# Altium footprint library lib_ic_FOOTPRINTS.PcbLib: 98 footprints (part 1 of 7)
Each footprint in its own frame and in the unit in brackets; x right, y up, seen from the top. Pads: shape width x height; smd on the part's side, far side on the other; paste and mask are expansions set on the pad; w line width, h text height; cw(c..) or ccw(c..) is an arc to the next point about the centre after c.
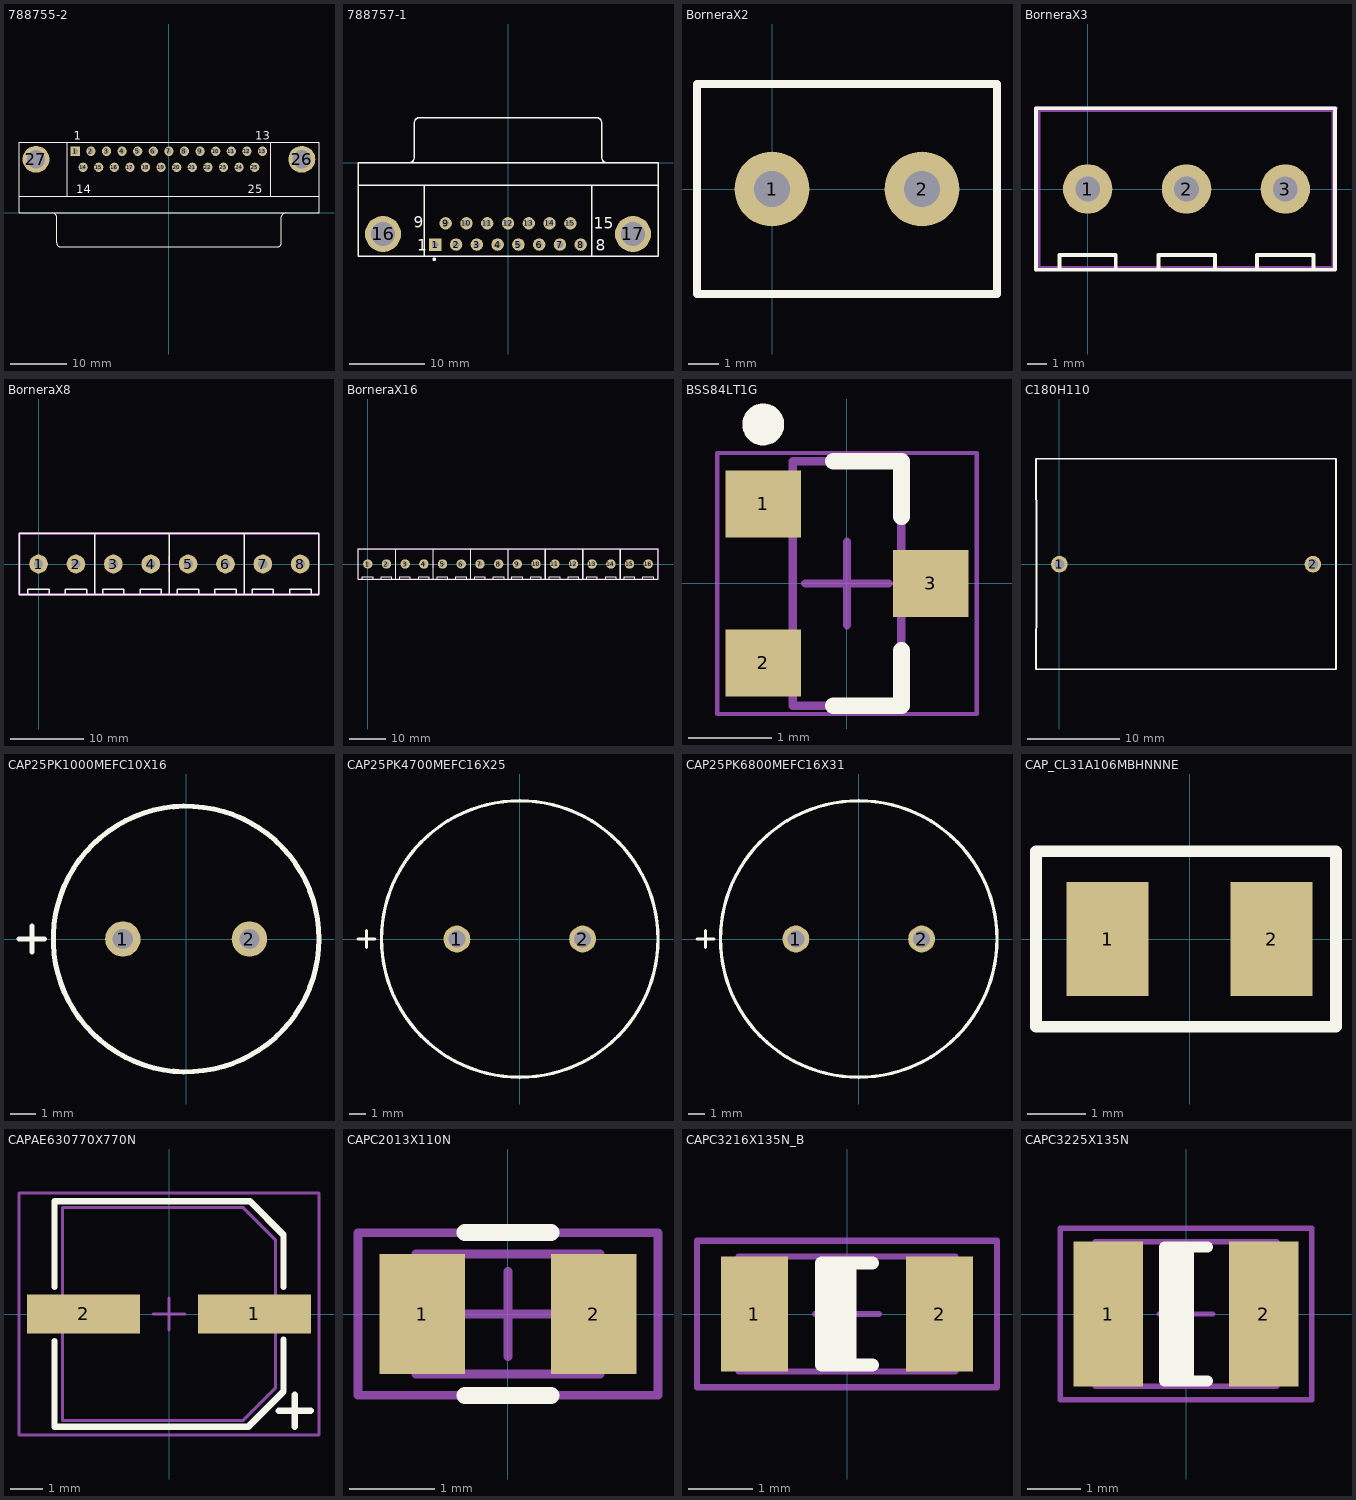
[diagram p0: the footprints below, top view; thin cyan lines are the x and y axes]

## 788755-2 [mil] "Connector; D Subminiature AMPLIMITE 2000; 25 Position; Right Angle"
height 501.97
pads (27):
  rect 65x65 hole 35: 1(-652.2,429.92)
  round 65 hole 35: 2(-543.5,429.92) 3(-434.8,429.92) 4(-326.1,429.92) 5(-217.4,429.92) 6(-108.7,429.92) 7(0,429.92) 8(108.7,429.92) 9(217.4,429.92) 10(326.1,429.92) 11(434.8,429.92) 12(543.5,429.92) 13(652.2,429.92) 14(-597.85,318.11) 15(-489.15,318.11) 16(-380.45,318.11) 17(-271.75,318.11) 18(-163.05,318.11) 19(-54.35,318.11) 20(54.35,318.11) 21(163.05,318.11) 22(271.75,318.11) 23(380.45,318.11) 24(489.15,318.11) 25(597.85,318.11)
  round 187.4 hole 128.35: 26(926.22,374.02) 27(-926.22,374.02)
Top Overlay:
  lines w7.87: -1044.57,118.11 1045.98,118.11 ; -810.12,-0.2 cw(c-810.12,-27.56) -782.76,-27.56 -782.76,-208.66 ; -782.56,-208.86 ccw(c-755.2,-208.86) -755.2,-236.22 756.61,-236.22 ccw(c756.61,-208.86) 783.98,-208.86 ; -707.95,118.11 -707.95,492.13 ; 709.37,118.11 709.37,492.13 ; 784.17,-208.66 784.17,-27.56 cw(c811.54,-27.56) 811.54,-0.2 ; -1044.57,0 -1044.57,492.13 1045.98,492.13 1045.98,0 -1044.57,0
  text "25" at 548.64,137.01 h59.06
  text "14" at -647.07,137.01 h59.06
  text "13" at 602.99,511.02 h59.06
  text "1" at -662.05,511.02 h59.06

## 788757-1 [mil] "Connector; D Subminiature AMPLIMITE 2000; 15 Position; Right Angle"
height 501.97
pads (17):
  rect 65x65 hole 35: 1(-381.69,-429.92)
  round 65 hole 35: 2(-272.64,-429.92) 3(-163.58,-429.92) 4(-54.53,-429.92) 5(54.53,-429.92) 6(163.58,-429.92) 7(272.64,-429.92) 8(381.69,-429.92) 9(-327.17,-318.11) 10(-218.11,-318.11) 11(-109.06,-318.11) 12(0,-318.11) 13(109.06,-318.11) 14(218.11,-318.11) 15(327.17,-318.11)
  round 188.98 hole 125.2: 16(-655.91,-374.02) 17(655.91,-374.02)
Top Overlay:
  circle w9.84: c-387.42,-507.5 r4.92
  lines w7.87: -787.4,-118.11 787.4,-118.11 ; -519.49,0.2 ccw(c-519.49,27.56) -492.13,27.56 -492.13,208.66 ; -491.93,208.86 cw(c-464.57,208.86) -464.57,236.22 464.57,236.22 cw(c464.57,208.86) 491.93,208.86 ; -438.58,-492.13 -438.58,-118.11 ; 438.58,-492.13 438.58,-118.11 ; 492.13,208.66 492.13,27.56 ccw(c519.49,27.56) 519.49,0.2 ; -787.4,-492.13 -787.4,0 787.4,0 787.4,-492.13 -787.4,-492.13
  text "1" at -477.5,-462.5 h59.06
  text "8" at 460,-462.5 h59.06
  text "15" at 450,-347.5 h59.06
  text "9" at -495,-342.5 h59.06

## BorneraX2 [mm]
pads (2):
  round 2.5 hole 1.2: 1(0,0) 2(5,0)
Top Overlay:
  lines w0.254: -2.5,-3.5 7.5,-3.5 7.5,3.5 -2.5,3.5 -2.5,-0.025 -2.5,-3.5
3D body: height 10, standoff 0, extent -2.375,-3.375 7.4,3.375

## BorneraX3 [mm]
pads (3):
  round 2.54 hole 1.27: 1(0,0) 2(5.08,0) 3(10.16,0)
Top Overlay:
  lines w0.2: -1.46,-4.15 -1.46,-3.4 1.44,-3.4 1.44,-4.15 ; 3.64,-4.15 3.64,-3.4 6.54,-3.4 6.54,-4.15 ; 8.7,-4.15 8.7,-3.4 11.6,-3.4 11.6,-4.15 ; 12.7,-4.15 -2.66,-4.15 -2.66,4.15 12.7,4.15 ; 12.707,-4.15 12.707,4.15
Mechanical 13:
  lines w0.2: 12.573,4.05 7.62,4.05 -2.54,4.05 -2.54,-4.05 7.62,-4.05 12.636,-4.05 12.636,4
Mechanical 15:
  lines w0.2: -2.66,-4.15 -2.66,4.15 7.69,4.15 ; 7.5,4.15 12.763,4.15
3D body "User Library-Terminal block 3 POS.STEP": height 10, standoff -3.05, extent -2.54,-3.173 12.7,4.327

## BorneraX8 [mm]
pads (8):
  round 2.54 hole 1.27: 1(0,0) 2(5.08,0) 3(10.16,0) 4(15.24,0) 5(20.32,0) 6(25.4,0) 7(30.48,0) 8(35.56,0)
Top Overlay:
  lines w0.2: -1.46,-4.15 -1.46,-3.4 1.44,-3.4 1.44,-4.15 ; 3.64,-4.15 3.64,-3.4 6.54,-3.4 6.54,-4.15 ; 7.5,-4.15 17.78,-4.15 ; 7.5,4.15 17.78,4.15 ; 7.62,4.127 7.598,4.15 -2.66,4.15 -2.66,-4.15 7.69,-4.15 ; 7.627,-4.15 7.627,4.15 ; 8.7,-4.15 8.7,-3.4 11.6,-3.4 11.6,-4.15 ; 13.8,-4.15 13.8,-3.4 16.7,-3.4 16.7,-4.15 ; 17.66,-4.15 27.94,-4.15 ; 17.66,4.15 27.94,4.15 ; 17.787,-4.15 17.787,4.15 ; 18.86,-4.15 18.86,-3.4 21.76,-3.4 21.76,-4.15 ; 23.96,-4.15 23.96,-3.4 26.86,-3.4 26.86,-4.15 ; 27.82,-4.15 38.107,-4.15 38.107,4.15 27.82,4.15 ; 27.947,-4.15 27.947,4.15 ; 29.02,-4.15 29.02,-3.4 31.92,-3.4 31.92,-4.15 ; 34.12,-4.15 34.12,-3.4 37.02,-3.4 37.02,-4.15
Mechanical 13:
  lines w0.2: -2.54,-4.05 -2.54,4.05 7.62,4.05 17.78,4.05 27.94,4.05 38.1,4.05 38.1,-4.05 27.94,-4.05 17.78,-4.05 7.62,-4.05 -2.54,-4.05
Mechanical 15:
  lines w0.1: 16.78,0 18.796,0 ; 17.78,-1.016 17.78,1
  lines w0.2: 7.5,-4.15 17.85,-4.15 ; 7.5,4.15 17.85,4.15 ; 7.69,-4.15 -2.66,-4.15 -2.66,4.15 7.69,4.15 ; 17.66,-4.15 28.01,-4.15 ; 17.66,4.15 28.01,4.15 ; 27.82,-4.15 38.1,-4.15 38.1,4.15 27.82,4.15
3D body "1729128.stp": height 10, standoff -3.5, extent -3.11,-4.05 7.62,4.05
3D body "1729128.stp": height 10, standoff -3.5, extent 7.05,-4.05 17.78,4.05
3D body "1729128.stp": height 10, standoff -3.5, extent 17.21,-4.05 27.94,4.05
3D body "1729128.stp": height 10, standoff -3.5, extent 27.37,-4.05 38.1,4.05

## BorneraX16 [mm]
pads (16):
  round 2.54 hole 1.27: 1(0,0) 2(5.08,0) 3(10.16,0) 4(15.24,0) 5(20.32,0) 6(25.4,0) 7(30.48,0) 8(35.56,0) 9(40.64,0) 10(45.72,0) 11(50.8,0) 12(55.88,0) 13(60.96,0) 14(66.04,0) 15(71.12,0) 16(76.2,0)
Top Overlay:
  lines w0.2: -1.46,-4.15 -1.46,-3.4 1.44,-3.4 1.44,-4.15 ; 3.64,-4.15 3.64,-3.4 6.54,-3.4 6.54,-4.15 ; 7.5,-4.15 17.78,-4.15 ; 7.5,4.15 17.78,4.15 ; 7.62,4.127 7.598,4.15 -2.66,4.15 -2.66,-4.15 7.69,-4.15 ; 7.627,-4.15 7.627,4.15 ; 8.7,-4.15 8.7,-3.4 11.6,-3.4 11.6,-4.15 ; 13.8,-4.15 13.8,-3.4 16.7,-3.4 16.7,-4.15 ; 17.66,-4.15 27.94,-4.15 ; 17.66,4.15 27.94,4.15 ; 17.787,-4.15 17.787,4.15 ; 18.86,-4.15 18.86,-3.4 21.76,-3.4 21.76,-4.15 ; 23.96,-4.15 23.96,-3.4 26.86,-3.4 26.86,-4.15 ; 27.82,-4.15 38.17,-4.15 ; 27.82,4.15 38.17,4.15 ; 27.947,-4.15 27.947,4.15 ; 29.02,-4.15 29.02,-3.4 31.92,-3.4 31.92,-4.15 ; 34.12,-4.15 34.12,-3.4 37.02,-3.4 37.02,-4.15 ; 37.98,-4.15 48.33,-4.15 ; 37.98,4.15 48.33,4.15 ; 38.107,-4.15 38.107,4.15 ; 38.22,-4.15 38.22,4.15 ; 39.18,-4.15 39.18,-3.4 42.08,-3.4 42.08,-4.15 ; 44.28,-4.15 44.28,-3.4 47.18,-3.4 47.18,-4.15 ; 48.14,-4.15 58.49,-4.15 ; 48.14,4.15 58.49,4.15 ; 48.267,-4.15 48.267,4.15 ; 48.38,-4.15 48.38,4.15 ; 49.34,-4.15 49.34,-3.4 52.24,-3.4 52.24,-4.15 ; 54.44,-4.15 54.44,-3.4 57.34,-3.4 57.34,-4.15 ; 58.3,-4.15 68.65,-4.15 ; 58.3,4.15 68.65,4.15 ; 58.427,-4.15 58.427,4.15 ; 58.54,-4.15 58.54,4.15 ; 59.5,-4.15 59.5,-3.4 62.4,-3.4 62.4,-4.15 ; 64.6,-4.15 64.6,-3.4 67.5,-3.4 67.5,-4.15 ; 68.46,-4.15 78.81,-4.15 ; 68.46,4.15 78.81,4.15 ; 68.587,-4.15 68.587,4.15 ; 68.7,-4.15 68.7,4.15 ; 69.66,-4.15 69.66,-3.4 72.56,-3.4 72.56,-4.15 ; 74.76,-4.15 74.76,-3.4 77.66,-3.4 77.66,-4.15 ; 78.86,-4.15 78.86,4.15
Mechanical 13:
  lines w0.2: 38.1,-4.05 27.94,-4.05 17.78,-4.05 7.62,-4.05 -2.54,-4.05 -2.54,4.05 7.62,4.05 17.78,4.05 27.94,4.05 38.1,4.05 ; 38.1,-4.05 38.1,4.05 ; 38.1,-4.05 48.26,-4.05 ; 38.1,4.05 48.26,4.05 ; 48.26,-4.05 48.26,4.05 ; 48.26,-4.05 58.42,-4.05 ; 48.26,4.05 58.42,4.05 ; 58.42,-4.05 58.42,4.05 ; 58.42,-4.05 68.58,-4.05 ; 58.42,4.05 68.58,4.05 ; 68.58,-4.05 68.58,4.05 ; 68.58,-4.05 78.74,-4.05 78.74,4.05 68.58,4.05
Mechanical 15:
  lines w0.1: 16.78,0 18.796,0 ; 17.78,-1.016 17.78,1
  lines w0.2: 7.5,-4.15 17.85,-4.15 ; 7.5,4.15 17.85,4.15 ; 7.69,-4.15 -2.66,-4.15 -2.66,4.15 7.69,4.15 ; 17.66,-4.15 28.01,-4.15 ; 17.66,4.15 28.01,4.15 ; 27.82,-4.15 38.17,-4.15 ; 27.82,4.15 38.17,4.15 ; 37.98,-4.15 48.33,-4.15 ; 37.98,4.15 48.33,4.15 ; 38.22,-4.15 38.22,4.15 ; 48.14,-4.15 58.49,-4.15 ; 48.14,4.15 58.49,4.15 ; 48.38,-4.15 48.38,4.15 ; 58.3,-4.15 68.65,-4.15 ; 58.3,4.15 68.65,4.15 ; 58.54,-4.15 58.54,4.15 ; 68.46,-4.15 78.81,-4.15 ; 68.46,4.15 78.81,4.15 ; 68.7,-4.15 68.7,4.15 ; 78.86,-4.15 78.86,4.15
3D body "1729128.stp": height 10, standoff -3.5, extent 27.37,-4.05 38.1,4.05
3D body "1729128.stp": height 10, standoff -3.5, extent 17.21,-4.05 27.94,4.05
3D body "1729128.stp": height 10, standoff -3.5, extent 7.05,-4.05 17.78,4.05
3D body "1729128.stp": height 10, standoff -3.5, extent -3.11,-4.05 7.62,4.05
3D body "1729128.stp": height 10, standoff -3.5, extent 37.53,-4.05 48.26,4.05
3D body "1729128.stp": height 10, standoff -3.5, extent 47.69,-4.05 58.42,4.05
3D body "1729128.stp": height 10, standoff -3.5, extent 57.85,-4.05 68.58,4.05
3D body "1729128.stp": height 10, standoff -3.5, extent 68.01,-4.05 78.74,4.05

## BSS84LT1G [mm] "SOT23, 3-Leads, Body 2.92x1.3mm, Pitch 0.95mm"
height 1.11
pads (3):
  rect 0.9x0.8 smd: 1(-1,0.95) 2(-1,-0.95) 3(1,0)
Top Overlay:
  circle w0.25: c-1,1.9 r0.125
  lines w0.2: -0.165,-1.46 0.65,-1.46 0.65,-0.8 ; -0.165,1.46 0.65,1.46 0.65,0.8
Mechanical 13:
  lines w0.1: -0.65,-1.46 0.65,-1.46 0.65,1.46 -0.65,1.46 -0.65,-1.46
Mechanical 15:
  lines w0.05: -1.55,-1.56 1.55,-1.56 1.55,1.56 -1.55,1.56 -1.55,-1.56
  lines w0.1: -0.5,0 0.5,0 ; 0,-0.5 0,0.5
3D body: height 1.11, standoff 0.01, extent -0.65,-1.46 0.65,1.46

## C180H110 [mm]
pads (2):
  round 1.8 hole 1.1: 1(0,0) 2(27.5,0)
Top Overlay:
  lines w0.2: 29.972,11.43 -2.539,11.43 -2.5,2.5 -2.5,-2.5 -2.54,-11.39 30,-11.39 30,11.43
3D body "capacitor film v1.step": height 36.5, standoff -6.1, extent -2.032,-11 29.468,11

## CAP25PK1000MEFC10X16 [mm]
pads (2):
  round 1.4 hole 0.8: 1(-2.5,0) 2(2.5,0)
Top Overlay:
  circle w0.2: c0,0 r5.25
  lines w0.2: -6.604,0 -5.588,0 ; -6.096,-0.508 -6.096,0.508
3D body "CAP_PKPZ_10X16_LOW_RUB.step": height 17.53, standoff -4.36, extent -5.249,-5.242 5.245,5.242

## CAP25PK4700MEFC16X25 [mm]
pads (2):
  round 1.6 hole 1: 1(-3.75,0) 2(3.75,0)
Top Overlay:
  circle w0.2: c0,0 r8.25
  lines w0.2: -9.652,0 -8.636,0 ; -9.144,-0.508 -9.144,0.508
3D body "CAP_PKPZ_16X25_RUB.step": height 27.02, standoff -4.98, extent -8.27,-8.255 8.255,8.255

## CAP25PK6800MEFC16X31 [mm]
pads (2):
  round 1.6 hole 1: 1(-3.75,0) 2(3.75,0)
Top Overlay:
  circle w0.2: c0,0 r8.25
  lines w0.2: -9.652,0 -8.636,0 ; -9.144,-0.508 -9.144,0.508
3D body "CAP_PKPZ_16X31P5_RUB.step": height 33.52, standoff -4.98, extent -8.255,-8.25 8.255,8.25

## CAP_CL31A106MBHNNNE [mm]
pads (2):
  rect 1.4x1.95 smd: 1(-1.4,0) 2(1.4,0)
Top Overlay:
  lines w0.2: -2.625,-1.5 -2.625,0 -2.625,1.5 2.5,1.5 2.5,-1.5 -2.625,-1.5
3D body "CL31A106MBHNNNE.stp": height 1.61, standoff 0.01, extent -1.6,-0.9 1.6,0.9

## CAPAE630770X770N [mm] "SMD Aluminum Electrolytic Capacitor; Body: 6.3x7.7 mm (DxL) // Source: UD series, Nichicon"
height 7.7
pads (2):
  rect 3.5x1.2 smd: 1(2.65,0) 2(-2.65,0)
Top Overlay:
  lines w0.2: -3.55,-0.85 -3.55,-3.5 2.45,-3.5 3.55,-2.4 3.55,-0.8 ; -3.55,0.85 -3.55,3.5 2.5,3.5 3.55,2.45 3.55,0.85 ; 3.4,-3 4.4,-3 ; 3.9,-3.5 3.9,-2.5
Mechanical 13:
  lines w0.1: -3.5,-0.4 -1.1,-0.4 -1.1,0.4 -3.5,0.4 -3.5,-0.4 ; -3.3,-3.3 -3.3,3.3 2.3,3.3 3.3,2.3 3.3,-2.3 2.3,-3.3 -3.3,-3.3 ; 1.1,-0.4 3.5,-0.4 3.5,0.4 1.1,0.4 1.1,-0.4
Mechanical 15:
  lines w0.1: -0.5,0 0.5,0 ; 0,-0.5 0,0.5 ; -4.65,-3.75 4.65,-3.75 4.65,3.75 -4.65,3.75 -4.65,-3.75
3D body "SW3dPS-E-cap_H.STEP": height 7.7, standoff 0, extent -3.652,-3.3 3.648,3.3

## CAPC2013X110N [mm] "Chip Capacitor, 0805, Body 2.0x1.3mm, IPC Medium Density"
height 1.1
pads (2):
  rect 1x1.4 smd: 1(-1,0) 2(1,0)
Top Overlay:
  lines w0.2: -0.5,-0.95 0.5,-0.95 ; -0.5,0.95 0.5,0.95
Mechanical 13:
  lines w0.1: -1.075,-0.7 1.075,-0.7 1.075,0.7 -1.075,0.7 -1.075,-0.7
Mechanical 15:
  lines w0.1: -0.5,0 0.5,0 ; 0,-0.5 0,0.5 ; -1.75,-0.95 1.75,-0.95 1.75,0.95 -1.75,0.95 -1.75,-0.95
3D body "User Library-SMD CAPACITOR0805.STEP": height 0.6, standoff 0, extent -1,-0.625 1,0.625

## CAPC3216X135N_B [mm] "Chip Capacitor, 1206, UL840 2mm, Body 3.2x1.6mm, IPC Medium Density"
height 1.35
pads (2):
  rect 1.05x1.8 smd: 1(-1.45,0) 2(1.45,0)
Top Overlay:
  rectangle: -0.4,-0.8 0.15,0.8
  lines w0.2: 0.4,-0.8 -0.4,-0.8 -0.4,0.8 0.4,0.8
Mechanical 13:
  lines w0.1: -1.7,-0.9 -1.7,0.9 1.7,0.9 1.7,-0.9 -1.7,-0.9
Mechanical 15:
  lines w0.1: -0.5,0 0.5,0 ; 0,-0.5 0,0.5 ; -2.35,-1.15 -2.35,1.15 2.35,1.15 2.35,-1.15 -2.35,-1.15
3D body "User Library-SMD CAPACITOR1206.STEP": height 0.79, standoff 0.01, extent -1.6,-0.8 1.6,0.8

## CAPC3225X135N [mm] "Chip Capacitor, 1210, Body 3.2x2.5mm, IPC Medium Density"
height 1.35
pads (2):
  rect 1.3x2.7 smd: 1(-1.45,0) 2(1.45,0)
Top Overlay:
  rectangle: -0.4,-1.25 0.15,1.25
  lines w0.2: 0.4,-1.25 -0.4,-1.25 -0.4,1.25 0.4,1.25
Mechanical 13:
  lines w0.1: -1.7,-1.35 1.7,-1.35 1.7,1.35 -1.7,1.35 -1.7,-1.35
Mechanical 15:
  lines w0.1: -0.5,0 0.5,0 ; 0,-0.5 0,0.5 ; -2.35,-1.6 2.35,-1.6 2.35,1.6 -2.35,1.6 -2.35,-1.6
3D body "User Library-SMD CAPACITOR1210.STEP": height 0.79, standoff 0.01, extent -1.6,-1.25 1.6,1.25